# Altium footprint library Compute Module .PcbLib: 21 footprints (part 1 of 2)
Each footprint in its own frame and in the unit in brackets; x right, y up, seen from the top. Pads: shape width x height; smd on the part's side, far side on the other; paste and mask are expansions set on the pad; w line width, h text height; cw(c..) or ccw(c..) is an arc to the next point about the centre after c.
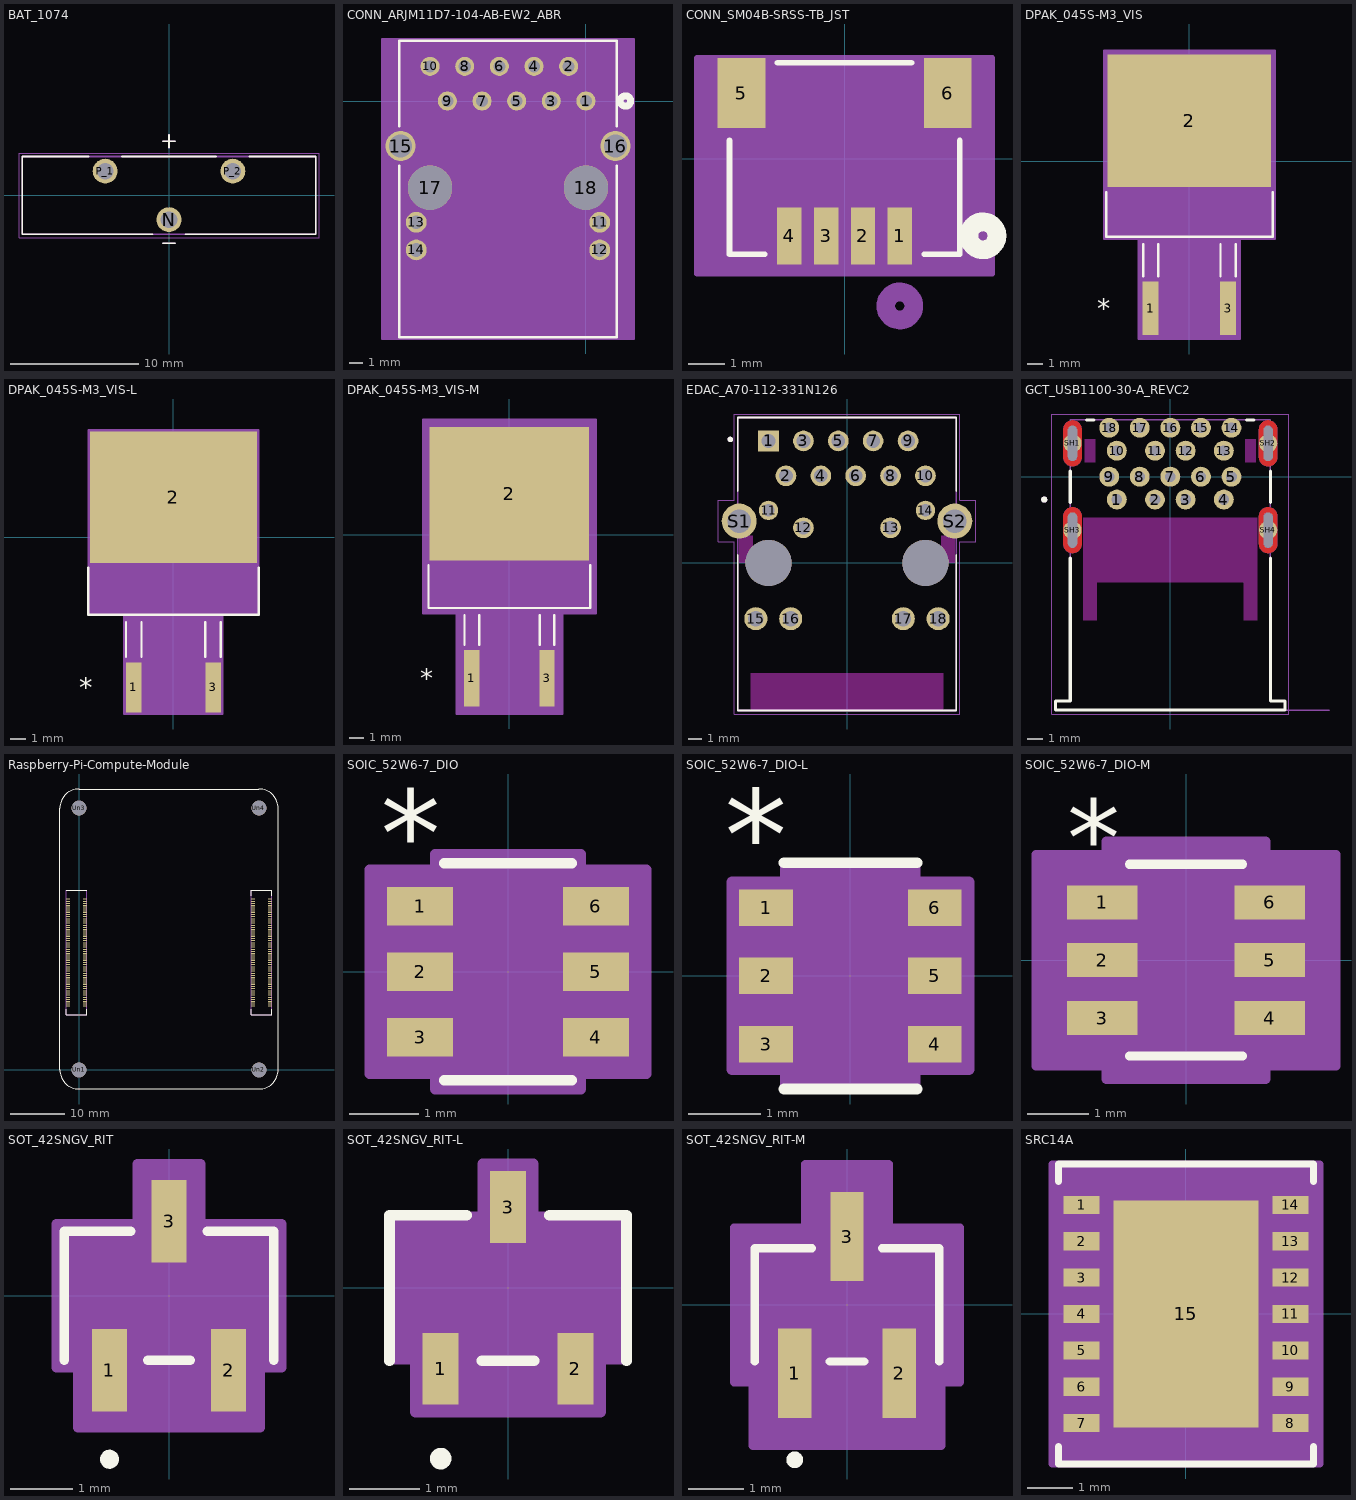
[diagram p0: the footprints below, top view; thin cyan lines are the x and y axes]

## BAT_1074 [mm]
height 24.9
pads (3):
  round 1.95 hole 1.3: N(0,-1.9) P_1(-5,1.9) P_2(5,1.9)
Top Overlay:
  lines w0.127: -6.295,3.05 -11.5,3.05 -11.5,-3.05 -1.295,-3.05 ; -3.705,3.05 3.705,3.05 ; -0.5,-3.75 0.5,-3.75 ; -0.5,4.25 0.5,4.25 ; 0,3.75 0,4.75 ; 1.295,-3.05 11.5,-3.05 11.5,3.05 6.295,3.05
Mechanical 13:
  lines w0.127: -0.5,-3.75 0.5,-3.75 ; -0.5,4.25 0.5,4.25 ; 0,3.75 0,4.75 ; -11.5,-3.05 -11.5,3.05 11.5,3.05 11.5,-3.05 -11.5,-3.05
Mechanical 15:
  lines w0.05: -11.75,-3.3 -11.75,3.3 11.75,3.3 11.75,-3.3 -11.75,-3.3
3D body "1074.step": height 19.88, standoff -1.52, extent -11.488,-2.925 11.488,3.175

## CONN_ARJM11D7-104-AB-EW2_ABR [mil] "Ethernet"
pads (18):
  round 55 / inner round 60 / far side round 55 hole 35 paste-99999 mask+0: 1(0,0) 2(-50,100) 3(-100,0) 4(-150,100) 5(-200,0) 6(-250,100) 7(-300,0) 8(-350,100) 9(-400,0) 10(-450,100)
  round 60 hole 40 paste-99999 mask+0: 11(39.76,-350) 12(39.76,-429.92) 13(-489.76,-350) 14(-489.76,-429.92)
  round 87 / inner round 60 / far side round 87 hole 67 paste-99999 mask+0: 15(-535.04,-129.92) 16(85.04,-129.92)
  round 128 / inner round 60 / far side round 128 hole 128 unplated paste-99999 mask-64: 17(-450,-250) 18(0,-250)
Top Overlay:
  circle w20: c114,0 r15
  lines w6: -539,-186.38 -539,-682 89,-682 89,-186.38 ; -539,-73.46 -539,174 89,174 89,-73.46
Bottom Overlay:
  circle w20: c114,0 r15
Mechanical 13:
  circle w20: c0,75 r15
  lines w1: -534,-677 84,-677 84,169 -534,169 -534,-677
Mechanical 15:
  region: 138.54,179 -588.54,179 -588.54,-687 138.54,-687
  lines w6: -588.54,-687 -588.54,179 138.54,179 138.54,-687 -588.54,-687
3D body "ARJM11D7-104-AB-EW2.STEP": height 543.32, standoff -141.55, extent -539.57,-680.19 89.57,172.19

## CONN_SM04B-SRSS-TB_JST [mil] "Fan Connector"
pads (6):
  rect 26x61 smd paste+0 mask+0: 1(59.06,-82.62) 2(19.68,-82.62) 3(-19.68,-82.62) 4(-59.06,-82.62)
  rect 51x75 smd paste-37.5 mask-37.5: 5(-110.24,69.94) 6(110.24,69.94)
Top Overlay:
  circle w20: c148,-82.62 r15
  lines w6: -123,19.34 -123,-102.5 -85.16,-102.5 ; -71.64,102.5 71.64,102.5 ; 85.16,-102.5 123,-102.5 123,19.34
Bottom Overlay:
  circle w20: c148,-82.62 r15
Mechanical 13:
  circle w20: c59.06,-157.62 r15
  lines w1: -118,-97.5 118,-97.5 118,97.5 -118,97.5 -118,-97.5
Mechanical 15:
  region: 157.74,107.5 -157.74,107.5 -157.74,-123.12 157.74,-123.12
  lines w6: -157.74,-123.12 -157.74,107.5 157.74,107.5 157.74,-123.12 -157.74,-123.12
3D body "SM04B-SRSS-TB.STEP": height 114.15, standoff -2.39, extent -118.11,-96.51 118.11,98.35

## DPAK_045S-M3_VIS [mil]
pads (3):
  rect 41x138 smd paste+0 mask+0: 1(-100,-380) 3(100,-380)
  rect 422x343 smd paste+0 mask+0: 2(0,104.5)
Top Overlay:
  lines w6: -215,-79.47 -215,-195 215,-195 215,-79.47 ; -119.5,-297 -119.5,-214 ; -80.5,-297 -80.5,-214 ; 80.5,-297 80.5,-214 ; 119.5,-297 119.5,-214
  text "*" at -237.5,-405 h50
Mechanical 13:
  lines w1: -210,-190 210,-190 210,190 -210,190 -210,-190 ; -119.5,-435 -119.5,-190 -80.5,-190 -80.5,-435 -119.5,-435 ; 80.5,-435 80.5,-190 119.5,-190 119.5,-435 80.5,-435
  text "*" at -112.5,-205 h50
Mechanical 15:
  region: -220,-200 -220,200 -220,286 220,286 220,200 220,-200 130.5,-200 130.5,-459 -130.5,-459 -130.5,-200
  lines w6: -220,-200 -220,200 -220,286 220,286 220,200 220,-200 130.5,-200 130.5,-459 -130.5,-459 -130.5,-200 -220,-200
3D body "DPAK_045S-M3_VIS.step": height 190.12, standoff -2.01, extent -210,-435 210,255

## DPAK_045S-M3_VIS-L [mil]
pads (3):
  rect 39x126 smd paste+0 mask+0: 1(-100,-378) 3(100,-378)
  rect 420x331 smd paste+0 mask+0: 2(0,100.5)
Top Overlay:
  lines w6: -215,-77.11 -215,-195 215,-195 215,-77.11 ; -119.5,-301 -119.5,-214 ; -80.5,-301 -80.5,-214 ; 80.5,-301 80.5,-214 ; 119.5,-301 119.5,-214
  text "*" at -237.5,-403 h50
Mechanical 13:
  lines w1: -210,-190 -210,190 210,190 210,-190 -210,-190 ; -119.5,-435 -80.5,-435 -80.5,-190 -119.5,-190 -119.5,-435 ; 80.5,-435 119.5,-435 119.5,-190 80.5,-190 80.5,-435
  text "*" at -112.5,-205 h50
Mechanical 15:
  region: -214,-194 -214,194 -214,270 214,270 214,194 214,-194 123.5,-194 123.5,-445 -123.5,-445 -123.5,-194
  lines w6: -214,-194 -123.5,-194 -123.5,-445 123.5,-445 123.5,-194 214,-194 214,194 214,270 -214,270 -214,194 -214,-194
3D body "DPAK_045S-M3_VIS.step": height 190.12, standoff -2.01, extent -210,-435 210,255

## DPAK_045S-M3_VIS-M [mil]
pads (3):
  rect 41x150 smd paste+0 mask+0: 1(-100,-382) 3(100,-382)
  rect 424x355 smd paste+0 mask+0: 2(0,108.5)
Top Overlay:
  lines w6: -215,-81.75 -215,-195 215,-195 215,-81.75 ; -119.5,-293 -119.5,-214 ; -80.5,-293 -80.5,-214 ; 80.5,-293 80.5,-214 ; 119.5,-293 119.5,-214
  text "*" at -237.5,-407 h50
Mechanical 13:
  lines w1: -210,-190 -210,190 210,190 210,-190 -210,-190 ; -119.5,-435 -80.5,-435 -80.5,-190 -119.5,-190 -119.5,-435 ; 80.5,-435 119.5,-435 119.5,-190 80.5,-190 80.5,-435
  text "*" at -112.5,-205 h50
Mechanical 15:
  region: -230,-210 -230,210 -230,306 230,306 230,210 230,-210 140.5,-210 140.5,-477 -140.5,-477 -140.5,-210
  lines w6: -230,-210 -140.5,-210 -140.5,-477 140.5,-477 140.5,-210 230,-210 230,210 230,306 -230,306 -230,210 -230,-210
3D body "DPAK_045S-M3_VIS.step": height 190.12, standoff -2.01, extent -210,-435 210,255

## EDAC_A70-112-331N126 [mm]
pads (22):
  rect 1.508x1.508 hole 1: 1(-5.715,8.89)
  round 1.508 hole 1: 2(-4.445,6.35) 3(-3.175,8.89) 4(-1.905,6.35) 5(-0.635,8.89) 6(0.635,6.35) 7(1.905,8.89) 8(3.175,6.35) 9(4.445,8.89) 10(5.715,6.35) 12(-3.175,2.56) 13(3.175,2.56)
  round 1.408 hole 0.9: 11(-5.715,3.83) 14(5.715,3.83)
  round 1.68 hole 1.12: 15(-6.64,-4.06) 16(-4.1,-4.06) 17(4.1,-4.06) 18(6.64,-4.06)
  round 2.55 hole 1.7: S1(-7.85,3.05) S2(7.85,3.05)
  round 3.35 hole 3.35 unplated: ""(-5.715,0) ""(5.715,0)
Top Overlay:
  circle w0.2: c-8.5,9 r0.1
  lines w0.127: -7.95,0.6 -7.95,-10.75 7.95,-10.75 7.95,0.6 ; -7.95,5.25 -7.95,10.6 7.95,10.6 7.95,5.25
Keep-Out Layer:
  region: 7.005,-10.75 -7.005,-10.75 -7.005,-8.05 7.005,-8.05
  region: 7.85,0 6.875,0 6.875,2 7.85,2
  region: -6.875,0 -7.85,0 -7.85,2 -6.875,2
Mechanical 13:
  circle w0.2: c-8.5,9 r0.1
  lines w0.127: -7.95,-10.75 7.95,-10.75 7.95,10.6 -7.95,10.6 -7.95,-10.75
Mechanical 15:
  lines w0.05: -9.38,1.53 -9.38,4.57 -8.2,4.57 -8.2,10.85 8.2,10.85 8.2,4.57 9.38,4.57 9.38,1.53 8.2,1.53 8.2,-11 -8.2,-11 -8.2,1.53 -9.38,1.53
3D body "A70-112-331N126--3DModel-STEP-56544.STEP": height 13.65, standoff -3.3, extent -8.1,-10.832 8.1,10.668

## GCT_USB1100-30-A_REVC2 [mm] "USB3.0 2 Sockets"
pads (22):
  round 1.3 hole 0.7: 1(-3.5,-1.5) 2(-1,-1.5) 3(1,-1.5) 4(3.5,-1.5) 5(4,0) 6(2,0) 7(0,0) 8(-2,0) 9(-4,0) 10(-3.5,1.7) 11(-1,1.7) 12(1,1.7) 13(3.5,1.7) 14(4,3.2) 15(2,3.2) 16(0,3.2) 17(-2,3.2) 18(-4,3.2)
  round 1.2 hole 0.6 slot 2.3 at 90 deg mask+0: SH1(-6.4,2.18) SH2(6.4,2.18) SH3(-6.4,-3.5) SH4(6.4,-3.5)
Top Layer:
  region: 6.431,-2.001 6.463,-2.003 6.494,-2.007 6.525,-2.013 6.555,-2.02 6.585,-2.029 6.615,-2.04 6.644,-2.052 6.672,-2.065 6.7,-2.08 6.727,-2.097 6.753,-2.115 6.778,-2.134 6.801,-2.154 6.824,-2.176 6.846,-2.199 6.866,-2.222 6.885,-2.247 6.903,-2.273 6.92,-2.3 6.935,-2.328 6.948,-2.356 6.96,-2.385 6.971,-2.415 6.98,-2.445 6.987,-2.475 6.993,-2.506 6.997,-2.537 6.999,-2.569 7,-2.6 7,-4.4 6.999,-4.431 6.997,-4.463 6.993,-4.494 6.987,-4.525 6.98,-4.555 6.971,-4.585 6.96,-4.615 6.948,-4.644 6.935,-4.672 6.92,-4.7 6.903,-4.727 6.885,-4.753 6.866,-4.778 6.846,-4.801 6.824,-4.824 6.801,-4.846 6.778,-4.866 6.753,-4.885 6.727,-4.903 6.7,-4.92 6.672,-4.935 6.644,-4.948 6.615,-4.96 6.585,-4.971 6.555,-4.98 6.525,-4.987 6.494,-4.993 6.463,-4.997 6.431,-4.999 6.4,-5 6.369,-4.999 6.337,-4.997 6.306,-4.993 6.275,-4.987 6.245,-4.98 6.215,-4.971 6.185,-4.96 6.156,-4.948 6.128,-4.935 6.1,-4.92 6.073,-4.903 6.047,-4.885 6.022,-4.866 5.999,-4.846 5.976,-4.824 5.954,-4.801 5.934,-4.778 5.915,-4.753 5.897,-4.727 5.88,-4.7 5.865,-4.672 5.852,-4.644 5.84,-4.615 5.829,-4.585 5.82,-4.555 5.813,-4.525 5.807,-4.494 5.803,-4.463 5.801,-4.431 5.8,-4.4 5.8,-2.6 5.801,-2.569 5.803,-2.537 5.807,-2.506 5.813,-2.475 5.82,-2.445 5.829,-2.415 5.84,-2.385 5.852,-2.356 5.865,-2.328 5.88,-2.3 5.897,-2.273 5.915,-2.247 5.934,-2.222 5.954,-2.199 5.976,-2.176 5.999,-2.154 6.022,-2.134 6.047,-2.115 6.073,-2.097 6.1,-2.08 6.128,-2.065 6.156,-2.052 6.185,-2.04 6.215,-2.029 6.245,-2.02 6.275,-2.013 6.306,-2.007 6.337,-2.003 6.369,-2.001 6.4,-2
  region: -6.369,-2.001 -6.337,-2.003 -6.306,-2.007 -6.275,-2.013 -6.245,-2.02 -6.215,-2.029 -6.185,-2.04 -6.156,-2.052 -6.128,-2.065 -6.1,-2.08 -6.073,-2.097 -6.047,-2.115 -6.022,-2.134 -5.999,-2.154 -5.976,-2.176 -5.954,-2.199 -5.934,-2.222 -5.915,-2.247 -5.897,-2.273 -5.88,-2.3 -5.865,-2.328 -5.852,-2.356 -5.84,-2.385 -5.829,-2.415 -5.82,-2.445 -5.813,-2.475 -5.807,-2.506 -5.803,-2.537 -5.801,-2.569 -5.8,-2.6 -5.8,-4.4 -5.801,-4.431 -5.803,-4.463 -5.807,-4.494 -5.813,-4.525 -5.82,-4.555 -5.829,-4.585 -5.84,-4.615 -5.852,-4.644 -5.865,-4.672 -5.88,-4.7 -5.897,-4.727 -5.915,-4.753 -5.934,-4.778 -5.954,-4.801 -5.976,-4.824 -5.999,-4.846 -6.022,-4.866 -6.047,-4.885 -6.073,-4.903 -6.1,-4.92 -6.128,-4.935 -6.156,-4.948 -6.185,-4.96 -6.215,-4.971 -6.245,-4.98 -6.275,-4.987 -6.306,-4.993 -6.337,-4.997 -6.369,-4.999 -6.4,-5 -6.431,-4.999 -6.463,-4.997 -6.494,-4.993 -6.525,-4.987 -6.555,-4.98 -6.585,-4.971 -6.615,-4.96 -6.644,-4.948 -6.672,-4.935 -6.7,-4.92 -6.727,-4.903 -6.753,-4.885 -6.778,-4.866 -6.801,-4.846 -6.824,-4.824 -6.846,-4.801 -6.866,-4.778 -6.885,-4.753 -6.903,-4.727 -6.92,-4.7 -6.935,-4.672 -6.948,-4.644 -6.96,-4.615 -6.971,-4.585 -6.98,-4.555 -6.987,-4.525 -6.993,-4.494 -6.997,-4.463 -6.999,-4.431 -7,-4.4 -7,-2.6 -6.999,-2.569 -6.997,-2.537 -6.993,-2.506 -6.987,-2.475 -6.98,-2.445 -6.971,-2.415 -6.96,-2.385 -6.948,-2.356 -6.935,-2.328 -6.92,-2.3 -6.903,-2.273 -6.885,-2.247 -6.866,-2.222 -6.846,-2.199 -6.824,-2.176 -6.801,-2.154 -6.778,-2.134 -6.753,-2.115 -6.727,-2.097 -6.7,-2.08 -6.672,-2.065 -6.644,-2.052 -6.615,-2.04 -6.585,-2.029 -6.555,-2.02 -6.525,-2.013 -6.494,-2.007 -6.463,-2.003 -6.431,-2.001 -6.4,-2
  region: 6.431,3.679 6.463,3.677 6.494,3.673 6.525,3.667 6.555,3.66 6.585,3.651 6.615,3.64 6.644,3.628 6.672,3.615 6.7,3.6 6.727,3.583 6.753,3.565 6.778,3.546 6.801,3.526 6.824,3.504 6.846,3.481 6.866,3.458 6.885,3.433 6.903,3.407 6.92,3.38 6.935,3.352 6.948,3.324 6.96,3.295 6.971,3.265 6.98,3.235 6.987,3.205 6.993,3.174 6.997,3.143 6.999,3.111 7,3.08 7,1.28 6.999,1.249 6.997,1.217 6.993,1.186 6.987,1.155 6.98,1.125 6.971,1.095 6.96,1.065 6.948,1.036 6.935,1.008 6.92,0.98 6.903,0.953 6.885,0.927 6.866,0.902 6.846,0.879 6.824,0.856 6.801,0.834 6.778,0.814 6.753,0.795 6.727,0.777 6.7,0.76 6.672,0.745 6.644,0.732 6.615,0.72 6.585,0.709 6.555,0.7 6.525,0.693 6.494,0.687 6.463,0.683 6.431,0.681 6.4,0.68 6.369,0.681 6.337,0.683 6.306,0.687 6.275,0.693 6.245,0.7 6.215,0.709 6.185,0.72 6.156,0.732 6.128,0.745 6.1,0.76 6.073,0.777 6.047,0.795 6.022,0.814 5.999,0.834 5.976,0.856 5.954,0.879 5.934,0.902 5.915,0.927 5.897,0.953 5.88,0.98 5.865,1.008 5.852,1.036 5.84,1.065 5.829,1.095 5.82,1.125 5.813,1.155 5.807,1.186 5.803,1.217 5.801,1.249 5.8,1.28 5.8,3.08 5.801,3.111 5.803,3.143 5.807,3.174 5.813,3.205 5.82,3.235 5.829,3.265 5.84,3.295 5.852,3.324 5.865,3.352 5.88,3.38 5.897,3.407 5.915,3.433 5.934,3.458 5.954,3.481 5.976,3.504 5.999,3.526 6.022,3.546 6.047,3.565 6.073,3.583 6.1,3.6 6.128,3.615 6.156,3.628 6.185,3.64 6.215,3.651 6.245,3.66 6.275,3.667 6.306,3.673 6.337,3.677 6.369,3.679 6.4,3.68
  region: -6.369,3.679 -6.337,3.677 -6.306,3.673 -6.275,3.667 -6.245,3.66 -6.215,3.651 -6.185,3.64 -6.156,3.628 -6.128,3.615 -6.1,3.6 -6.073,3.583 -6.047,3.565 -6.022,3.546 -5.999,3.526 -5.976,3.504 -5.954,3.481 -5.934,3.458 -5.915,3.433 -5.897,3.407 -5.88,3.38 -5.865,3.352 -5.852,3.324 -5.84,3.295 -5.829,3.265 -5.82,3.235 -5.813,3.205 -5.807,3.174 -5.803,3.143 -5.801,3.111 -5.8,3.08 -5.8,1.28 -5.801,1.249 -5.803,1.217 -5.807,1.186 -5.813,1.155 -5.82,1.125 -5.829,1.095 -5.84,1.065 -5.852,1.036 -5.865,1.008 -5.88,0.98 -5.897,0.953 -5.915,0.927 -5.934,0.902 -5.954,0.879 -5.976,0.856 -5.999,0.834 -6.022,0.814 -6.047,0.795 -6.073,0.777 -6.1,0.76 -6.128,0.745 -6.156,0.732 -6.185,0.72 -6.215,0.709 -6.245,0.7 -6.275,0.693 -6.306,0.687 -6.337,0.683 -6.369,0.681 -6.4,0.68 -6.431,0.681 -6.463,0.683 -6.494,0.687 -6.525,0.693 -6.555,0.7 -6.585,0.709 -6.615,0.72 -6.644,0.732 -6.672,0.745 -6.7,0.76 -6.727,0.777 -6.753,0.795 -6.778,0.814 -6.801,0.834 -6.824,0.856 -6.846,0.879 -6.866,0.902 -6.885,0.927 -6.903,0.953 -6.92,0.98 -6.935,1.008 -6.948,1.036 -6.96,1.065 -6.971,1.095 -6.98,1.125 -6.987,1.155 -6.993,1.186 -6.997,1.217 -6.999,1.249 -7,1.28 -7,3.08 -6.999,3.111 -6.997,3.143 -6.993,3.174 -6.987,3.205 -6.98,3.235 -6.971,3.265 -6.96,3.295 -6.948,3.324 -6.935,3.352 -6.92,3.38 -6.903,3.407 -6.885,3.433 -6.866,3.458 -6.846,3.481 -6.824,3.504 -6.801,3.526 -6.778,3.546 -6.753,3.565 -6.727,3.583 -6.7,3.6 -6.672,3.615 -6.644,3.628 -6.615,3.64 -6.585,3.651 -6.555,3.66 -6.525,3.667 -6.494,3.673 -6.463,3.677 -6.431,3.679 -6.4,3.68
Bottom Layer:
  region: 6.431,-2.001 6.463,-2.003 6.494,-2.007 6.525,-2.013 6.555,-2.02 6.585,-2.029 6.615,-2.04 6.644,-2.052 6.672,-2.065 6.7,-2.08 6.727,-2.097 6.753,-2.115 6.778,-2.134 6.801,-2.154 6.824,-2.176 6.846,-2.199 6.866,-2.222 6.885,-2.247 6.903,-2.273 6.92,-2.3 6.935,-2.328 6.948,-2.356 6.96,-2.385 6.971,-2.415 6.98,-2.445 6.987,-2.475 6.993,-2.506 6.997,-2.537 6.999,-2.569 7,-2.6 7,-4.4 6.999,-4.431 6.997,-4.463 6.993,-4.494 6.987,-4.525 6.98,-4.555 6.971,-4.585 6.96,-4.615 6.948,-4.644 6.935,-4.672 6.92,-4.7 6.903,-4.727 6.885,-4.753 6.866,-4.778 6.846,-4.801 6.824,-4.824 6.801,-4.846 6.778,-4.866 6.753,-4.885 6.727,-4.903 6.7,-4.92 6.672,-4.935 6.644,-4.948 6.615,-4.96 6.585,-4.971 6.555,-4.98 6.525,-4.987 6.494,-4.993 6.463,-4.997 6.431,-4.999 6.4,-5 6.369,-4.999 6.337,-4.997 6.306,-4.993 6.275,-4.987 6.245,-4.98 6.215,-4.971 6.185,-4.96 6.156,-4.948 6.128,-4.935 6.1,-4.92 6.073,-4.903 6.047,-4.885 6.022,-4.866 5.999,-4.846 5.976,-4.824 5.954,-4.801 5.934,-4.778 5.915,-4.753 5.897,-4.727 5.88,-4.7 5.865,-4.672 5.852,-4.644 5.84,-4.615 5.829,-4.585 5.82,-4.555 5.813,-4.525 5.807,-4.494 5.803,-4.463 5.801,-4.431 5.8,-4.4 5.8,-2.6 5.801,-2.569 5.803,-2.537 5.807,-2.506 5.813,-2.475 5.82,-2.445 5.829,-2.415 5.84,-2.385 5.852,-2.356 5.865,-2.328 5.88,-2.3 5.897,-2.273 5.915,-2.247 5.934,-2.222 5.954,-2.199 5.976,-2.176 5.999,-2.154 6.022,-2.134 6.047,-2.115 6.073,-2.097 6.1,-2.08 6.128,-2.065 6.156,-2.052 6.185,-2.04 6.215,-2.029 6.245,-2.02 6.275,-2.013 6.306,-2.007 6.337,-2.003 6.369,-2.001 6.4,-2
  region: -6.369,-2.001 -6.337,-2.003 -6.306,-2.007 -6.275,-2.013 -6.245,-2.02 -6.215,-2.029 -6.185,-2.04 -6.156,-2.052 -6.128,-2.065 -6.1,-2.08 -6.073,-2.097 -6.047,-2.115 -6.022,-2.134 -5.999,-2.154 -5.976,-2.176 -5.954,-2.199 -5.934,-2.222 -5.915,-2.247 -5.897,-2.273 -5.88,-2.3 -5.865,-2.328 -5.852,-2.356 -5.84,-2.385 -5.829,-2.415 -5.82,-2.445 -5.813,-2.475 -5.807,-2.506 -5.803,-2.537 -5.801,-2.569 -5.8,-2.6 -5.8,-4.4 -5.801,-4.431 -5.803,-4.463 -5.807,-4.494 -5.813,-4.525 -5.82,-4.555 -5.829,-4.585 -5.84,-4.615 -5.852,-4.644 -5.865,-4.672 -5.88,-4.7 -5.897,-4.727 -5.915,-4.753 -5.934,-4.778 -5.954,-4.801 -5.976,-4.824 -5.999,-4.846 -6.022,-4.866 -6.047,-4.885 -6.073,-4.903 -6.1,-4.92 -6.128,-4.935 -6.156,-4.948 -6.185,-4.96 -6.215,-4.971 -6.245,-4.98 -6.275,-4.987 -6.306,-4.993 -6.337,-4.997 -6.369,-4.999 -6.4,-5 -6.431,-4.999 -6.463,-4.997 -6.494,-4.993 -6.525,-4.987 -6.555,-4.98 -6.585,-4.971 -6.615,-4.96 -6.644,-4.948 -6.672,-4.935 -6.7,-4.92 -6.727,-4.903 -6.753,-4.885 -6.778,-4.866 -6.801,-4.846 -6.824,-4.824 -6.846,-4.801 -6.866,-4.778 -6.885,-4.753 -6.903,-4.727 -6.92,-4.7 -6.935,-4.672 -6.948,-4.644 -6.96,-4.615 -6.971,-4.585 -6.98,-4.555 -6.987,-4.525 -6.993,-4.494 -6.997,-4.463 -6.999,-4.431 -7,-4.4 -7,-2.6 -6.999,-2.569 -6.997,-2.537 -6.993,-2.506 -6.987,-2.475 -6.98,-2.445 -6.971,-2.415 -6.96,-2.385 -6.948,-2.356 -6.935,-2.328 -6.92,-2.3 -6.903,-2.273 -6.885,-2.247 -6.866,-2.222 -6.846,-2.199 -6.824,-2.176 -6.801,-2.154 -6.778,-2.134 -6.753,-2.115 -6.727,-2.097 -6.7,-2.08 -6.672,-2.065 -6.644,-2.052 -6.615,-2.04 -6.585,-2.029 -6.555,-2.02 -6.525,-2.013 -6.494,-2.007 -6.463,-2.003 -6.431,-2.001 -6.4,-2
  region: 6.431,3.679 6.463,3.677 6.494,3.673 6.525,3.667 6.555,3.66 6.585,3.651 6.615,3.64 6.644,3.628 6.672,3.615 6.7,3.6 6.727,3.583 6.753,3.565 6.778,3.546 6.801,3.526 6.824,3.504 6.846,3.481 6.866,3.458 6.885,3.433 6.903,3.407 6.92,3.38 6.935,3.352 6.948,3.324 6.96,3.295 6.971,3.265 6.98,3.235 6.987,3.205 6.993,3.174 6.997,3.143 6.999,3.111 7,3.08 7,1.28 6.999,1.249 6.997,1.217 6.993,1.186 6.987,1.155 6.98,1.125 6.971,1.095 6.96,1.065 6.948,1.036 6.935,1.008 6.92,0.98 6.903,0.953 6.885,0.927 6.866,0.902 6.846,0.879 6.824,0.856 6.801,0.834 6.778,0.814 6.753,0.795 6.727,0.777 6.7,0.76 6.672,0.745 6.644,0.732 6.615,0.72 6.585,0.709 6.555,0.7 6.525,0.693 6.494,0.687 6.463,0.683 6.431,0.681 6.4,0.68 6.369,0.681 6.337,0.683 6.306,0.687 6.275,0.693 6.245,0.7 6.215,0.709 6.185,0.72 6.156,0.732 6.128,0.745 6.1,0.76 6.073,0.777 6.047,0.795 6.022,0.814 5.999,0.834 5.976,0.856 5.954,0.879 5.934,0.902 5.915,0.927 5.897,0.953 5.88,0.98 5.865,1.008 5.852,1.036 5.84,1.065 5.829,1.095 5.82,1.125 5.813,1.155 5.807,1.186 5.803,1.217 5.801,1.249 5.8,1.28 5.8,3.08 5.801,3.111 5.803,3.143 5.807,3.174 5.813,3.205 5.82,3.235 5.829,3.265 5.84,3.295 5.852,3.324 5.865,3.352 5.88,3.38 5.897,3.407 5.915,3.433 5.934,3.458 5.954,3.481 5.976,3.504 5.999,3.526 6.022,3.546 6.047,3.565 6.073,3.583 6.1,3.6 6.128,3.615 6.156,3.628 6.185,3.64 6.215,3.651 6.245,3.66 6.275,3.667 6.306,3.673 6.337,3.677 6.369,3.679 6.4,3.68
  region: -6.369,3.679 -6.337,3.677 -6.306,3.673 -6.275,3.667 -6.245,3.66 -6.215,3.651 -6.185,3.64 -6.156,3.628 -6.128,3.615 -6.1,3.6 -6.073,3.583 -6.047,3.565 -6.022,3.546 -5.999,3.526 -5.976,3.504 -5.954,3.481 -5.934,3.458 -5.915,3.433 -5.897,3.407 -5.88,3.38 -5.865,3.352 -5.852,3.324 -5.84,3.295 -5.829,3.265 -5.82,3.235 -5.813,3.205 -5.807,3.174 -5.803,3.143 -5.801,3.111 -5.8,3.08 -5.8,1.28 -5.801,1.249 -5.803,1.217 -5.807,1.186 -5.813,1.155 -5.82,1.125 -5.829,1.095 -5.84,1.065 -5.852,1.036 -5.865,1.008 -5.88,0.98 -5.897,0.953 -5.915,0.927 -5.934,0.902 -5.954,0.879 -5.976,0.856 -5.999,0.834 -6.022,0.814 -6.047,0.795 -6.073,0.777 -6.1,0.76 -6.128,0.745 -6.156,0.732 -6.185,0.72 -6.215,0.709 -6.245,0.7 -6.275,0.693 -6.306,0.687 -6.337,0.683 -6.369,0.681 -6.4,0.68 -6.431,0.681 -6.463,0.683 -6.494,0.687 -6.525,0.693 -6.555,0.7 -6.585,0.709 -6.615,0.72 -6.644,0.732 -6.672,0.745 -6.7,0.76 -6.727,0.777 -6.753,0.795 -6.778,0.814 -6.801,0.834 -6.824,0.856 -6.846,0.879 -6.866,0.902 -6.885,0.927 -6.903,0.953 -6.92,0.98 -6.935,1.008 -6.948,1.036 -6.96,1.065 -6.971,1.095 -6.98,1.125 -6.987,1.155 -6.993,1.186 -6.997,1.217 -6.999,1.249 -7,1.28 -7,3.08 -6.999,3.111 -6.997,3.143 -6.993,3.174 -6.987,3.205 -6.98,3.235 -6.971,3.265 -6.96,3.295 -6.948,3.324 -6.935,3.352 -6.92,3.38 -6.903,3.407 -6.885,3.433 -6.866,3.458 -6.846,3.481 -6.824,3.504 -6.801,3.526 -6.778,3.546 -6.753,3.565 -6.727,3.583 -6.7,3.6 -6.672,3.615 -6.644,3.628 -6.615,3.64 -6.585,3.651 -6.555,3.66 -6.525,3.667 -6.494,3.673 -6.463,3.677 -6.431,3.679 -6.4,3.68
Top Overlay:
  circle w0.2: c-8.25,-1.5 r0.1
  lines w0.2: -6.55,-5.32 -6.55,-14.67 -7.5,-14.67 -7.5,-15.28 7.5,-15.28 7.5,-14.67 6.55,-14.67 6.55,-5.32 ; -6.55,-1.68 -6.55,0.36 ; -5.48,3.72 -5,3.72 ; 5,3.72 5.48,3.72 ; 6.55,-1.68 6.55,0.36
Top Solder:
  drawing of 4 lines, arcs and shapes, not listed
Bottom Solder:
  drawing of 4 lines, arcs and shapes, not listed
Keep-Out Layer:
  region: 5.6,0.95 4.9,0.95 4.9,2.45 5.6,2.45
  region: -4.9,0.95 -5.6,0.95 -5.6,2.45 -4.9,2.45
  region: 5.7,-9.4 4.8,-9.4 4.8,-6.9 -4.8,-6.9 -4.8,-9.4 -5.7,-9.4 -5.7,-2.7 5.7,-2.7
  region: 5.6,0.95 4.9,0.95 4.9,2.45 5.6,2.45
  region: -4.9,0.95 -5.6,0.95 -5.6,2.45 -4.9,2.45
  region: 5.7,-9.4 4.8,-9.4 4.8,-6.9 -4.8,-6.9 -4.8,-9.4 -5.7,-9.4 -5.7,-2.7 5.7,-2.7
Mechanical 13:
  circle w0.2: c-8.25,-1.5 r0.1
  lines w0.1: 10.4,-15.28 7.5,-15.28 ; 7.5,-15.28 -7.5,-15.28 -7.5,-14.67 -6.55,-14.67 -6.55,3.72 6.55,3.72 6.55,-14.67 7.5,-14.67 7.5,-15.28
  text "PCB EDGE" at 8.1,-15.08 h1.27
Mechanical 15:
  lines w0.05: -7.75,-15.53 7.75,-15.53 7.75,4.1 -7.75,4.1 -7.75,-15.53
3D body "usb1100-30-a.stp": height 16.2, standoff -1.68, extent -7.5,-15.317 7.5,3.683

## Raspberry-Pi-Compute-Module [mm] "Compute Module Base"
pads (204):
  rect 0.7x0.2 smd: 1(-2,31.3) 2(1.08,31.3) 3(-2,30.9) 4(1.08,30.9) 5(-2,30.5) 6(1.08,30.5) 7(-2,30.1) 8(1.08,30.1) 9(-2,29.7) 10(1.08,29.7) 11(-2,29.3) 12(1.08,29.3) 13(-2,28.9) 14(1.08,28.9) 15(-2,28.5) 16(1.08,28.5) 17(-2,28.1) 18(1.08,28.1) 19(-2,27.7) 20(1.08,27.7) 21(-2,27.3) 22(1.08,27.3) 23(-2,26.9) 24(1.08,26.9) 25(-2,26.5) 26(1.08,26.5) 27(-2,26.1) 28(1.08,26.1) 29(-2,25.7) 30(1.08,25.7) 31(-2,25.3) 32(1.08,25.3) 33(-2,24.9) 34(1.08,24.9) 35(-2,24.5) 36(1.08,24.5) 37(-2,24.1) 38(1.08,24.1) 39(-2,23.7) 40(1.08,23.7) 41(-2,23.3) 42(1.08,23.3) 43(-2,22.9) 44(1.08,22.9) 45(-2,22.5) 46(1.08,22.5) 47(-2,22.1) 48(1.08,22.1) 49(-2,21.7) 50(1.08,21.7) 51(-2,21.3) 52(1.08,21.3) 53(-2,20.9) 54(1.08,20.9) 55(-2,20.5) 56(1.08,20.5) 57(-2,20.1) 58(1.08,20.1) 59(-2,19.7) 60(1.08,19.7) 61(-2,19.3) 62(1.08,19.3) 63(-2,18.9) 64(1.08,18.9) 65(-2,18.5) 66(1.08,18.5) 67(-2,18.1) 68(1.08,18.1) 69(-2,17.7) 70(1.08,17.7) 71(-2,17.3) 72(1.08,17.3) 73(-2,16.9) 74(1.08,16.9) 75(-2,16.5) 76(1.08,16.5) 77(-2,16.1) 78(1.08,16.1) 79(-2,15.7) 80(1.08,15.7) 81(-2,15.3) 82(1.08,15.3) 83(-2,14.9) 84(1.08,14.9) 85(-2,14.5) 86(1.08,14.5) 87(-2,14.1) 88(1.08,14.1) 89(-2,13.7) 90(1.08,13.7) 91(-2,13.3) 92(1.08,13.3) 93(-2,12.9) 94(1.08,12.9) 95(-2,12.5) 96(1.08,12.5) 97(-2,12.1) 98(1.08,12.1) 99(-2,11.7) 100(1.08,11.7) 101(31.92,31.3) 102(35,31.3) 103(31.92,30.9) 104(35,30.9) 105(31.92,30.5) 106(35,30.5) 107(31.92,30.1) 108(35,30.1) 109(31.92,29.7) 110(35,29.7) 111(31.92,29.3) 112(35,29.3) 113(31.92,28.9) 114(35,28.9) 115(31.92,28.5) 116(35,28.5) 117(31.92,28.1) 118(35,28.1) 119(31.92,27.7) 120(35,27.7) 121(31.92,27.3) 122(35,27.3) 123(31.92,26.9) 124(35,26.9) 125(31.92,26.5) 126(35,26.5) 127(31.92,26.1) 128(35,26.1) 129(31.92,25.7) 130(35,25.7) 131(31.92,25.3) 132(35,25.3) 133(31.92,24.9) 134(35,24.9) 135(31.92,24.5) 136(35,24.5) 137(31.92,24.1) 138(35,24.1) 139(31.92,23.7) 140(35,23.7) 141(31.92,23.3) 142(35,23.3) 143(31.92,22.9) 144(35,22.9) 145(31.92,22.5) 146(35,22.5) 147(31.92,22.1) 148(35,22.1) 149(31.92,21.7) 150(35,21.7) 151(31.92,21.3) 152(35,21.3) 153(31.92,20.9) 154(35,20.9) 155(31.92,20.5) 156(35,20.5) 157(31.92,20.1) 158(35,20.1) 159(31.92,19.7) 160(35,19.7) 161(31.92,19.3) 162(35,19.3) 163(31.92,18.9) 164(35,18.9) 165(31.92,18.5) 166(35,18.5) 167(31.92,18.1) 168(35,18.1) 169(31.92,17.7) 170(35,17.7) 171(31.92,17.3) 172(35,17.3) 173(31.92,16.9) 174(35,16.9) 175(31.92,16.5) 176(35,16.5) 177(31.92,16.1) 178(35,16.1) 179(31.92,15.7) 180(35,15.7) 181(31.92,15.3) 182(35,15.3) 183(31.92,14.9) 184(35,14.9) 185(31.92,14.5) 186(35,14.5) 187(31.92,14.1) 188(35,14.1) 189(31.92,13.7) 190(35,13.7) 191(31.92,13.3) 192(35,13.3) 193(31.92,12.9) 194(35,12.9) 195(31.92,12.5) 196(35,12.5) 197(31.92,12.1) 198(35,12.1) 199(31.92,11.7) 200(35,11.7)
  round 2.7 hole 2.7: Un1(0,0) Un2(33,0) Un3(0,48) Un4(33,48)
Top Overlay:
  lines w0.12: -2.35,11.1 -2.35,10.1 1.43,10.1 1.43,11.1 ; -2.35,32.9 1.43,32.9 ; 31.57,11.1 31.57,10.1 35.35,10.1 35.35,11.1 ; 31.57,31.9 31.57,32.9 35.35,32.9 35.35,31.9 ; -3.5,0 ccw(c0,0) 0,-3.5 33,-3.5 ccw(c33,0) 36.5,0 36.5,48 ccw(c33,48) 33,51.5 0,51.5 ccw(c0,48) -3.5,48 -3.5,0
Mechanical 12:
  lines w0.12: -2.35,10.1 -2.35,32.9 1.43,32.9 1.43,10.1 -2.35,10.1 ; 31.57,10.1 35.35,10.1 35.35,32.9 31.57,32.9 31.57,10.1
3D body "10164227-1001a1rlf.stp": height 1.41, standoff -0.04, extent -2.15,10.2 1.23,32.8
3D body "10164227-1001a1rlf.stp": height 1.41, standoff -0.04, extent 31.77,10.2 35.15,32.8

## SOIC_52W6-7_DIO [mil]
pads (6):
  rect 37.5x22 smd paste+0 mask+0: 1(-50.25,37.4) 2(-50.25,0) 3(-50.25,-37.4) 4(50.25,-37.4) 5(50.25,0) 6(50.25,37.4)
Top Overlay:
  lines w6: -36.5,-62 36.5,-62 ; -36.5,62 36.5,62
  text "*" at -72.75,54.4 h50
Mechanical 13:
  lines w0: -12,57 ccw(c0,57) 12,57
  lines w1: -55,-47.4 -31.5,-47.4 -31.5,-27.4 -55,-27.4 -55,-47.4 ; -55,-10 -31.5,-10 -31.5,10 -55,10 -55,-10 ; -55,27.4 -31.5,27.4 -31.5,47.4 -55,47.4 -55,27.4 ; -31.5,-57 -31.5,57 31.5,57 31.5,-57 -31.5,-57 ; 31.5,-47.4 55,-47.4 55,-27.4 31.5,-27.4 31.5,-47.4 ; 31.5,-10 55,-10 55,10 31.5,10 31.5,-10 ; 31.5,27.4 55,27.4 55,47.4 31.5,47.4 31.5,27.4
  text "*" at -29,4 h50
Mechanical 15:
  region: -41.5,-58.4 -79,-58.4 -79,58.4 -41.5,58.4 -41.5,67 41.5,67 41.5,58.4 79,58.4 79,-58.4 41.5,-58.4 41.5,-67 -41.5,-67
  lines w6: -79,-58.4 -41.5,-58.4 -41.5,-67 41.5,-67 41.5,-58.4 79,-58.4 79,58.4 41.5,58.4 41.5,67 -41.5,67 -41.5,58.4 -79,58.4 -79,-58.4
3D body "SOIC_52W6-7_DIO.step": height 57.09, standoff 0, extent -55,-57.01 55,57.01

## SOIC_52W6-7_DIO-L [mil]
pads (6):
  rect 29.5x20 smd paste+0 mask+0: 1(-46.25,37.4) 2(-46.25,0) 3(-46.25,-37.4) 4(46.25,-37.4) 5(46.25,0) 6(46.25,37.4)
Top Overlay:
  lines w6: -36.5,-62 36.5,-62 ; -36.5,62 36.5,62
  text "*" at -68.75,52.4 h50
Mechanical 13:
  lines w0: -12,57 ccw(c0,57) 12,57
  lines w1: -55,-47.4 -31.5,-47.4 -31.5,-27.4 -55,-27.4 -55,-47.4 ; -55,-10 -31.5,-10 -31.5,10 -55,10 -55,-10 ; -55,27.4 -31.5,27.4 -31.5,47.4 -55,47.4 -55,27.4 ; -31.5,-57 -31.5,57 31.5,57 31.5,-57 -31.5,-57 ; 31.5,-47.4 55,-47.4 55,-27.4 31.5,-27.4 31.5,-47.4 ; 31.5,-10 55,-10 55,10 31.5,10 31.5,-10 ; 31.5,27.4 55,27.4 55,47.4 31.5,47.4 31.5,27.4
  text "*" at -29,4 h50
Mechanical 15:
  region: -35.5,-51.4 -65,-51.4 -65,51.4 -35.5,51.4 -35.5,61 35.5,61 35.5,51.4 65,51.4 65,-51.4 35.5,-51.4 35.5,-61 -35.5,-61
  lines w6: -65,-51.4 -35.5,-51.4 -35.5,-61 35.5,-61 35.5,-51.4 65,-51.4 65,51.4 35.5,51.4 35.5,61 -35.5,61 -35.5,51.4 -65,51.4 -65,-51.4
3D body "SOIC_52W6-7_DIO.step": height 57.09, standoff 0, extent -55,-57.01 55,57.01

## SOIC_52W6-7_DIO-M [mil]
pads (6):
  rect 45.5x22 smd paste+0 mask+0: 1(-54.25,37.4) 2(-54.25,0) 3(-54.25,-37.4) 4(54.25,-37.4) 5(54.25,0) 6(54.25,37.4)
Top Overlay:
  lines w6: -36.5,-62 36.5,-62 ; -36.5,62 36.5,62
  text "*" at -76.75,54.4 h50
Mechanical 13:
  lines w0: -12,57 ccw(c0,57) 12,57
  lines w1: -55,-47.4 -55,-27.4 -31.5,-27.4 -31.5,-47.4 -55,-47.4 ; -55,-10 -55,10 -31.5,10 -31.5,-10 -55,-10 ; -55,27.4 -55,47.4 -31.5,47.4 -31.5,27.4 -55,27.4 ; -31.5,-57 31.5,-57 31.5,57 -31.5,57 -31.5,-57 ; 31.5,-47.4 31.5,-27.4 55,-27.4 55,-47.4 31.5,-47.4 ; 31.5,-10 31.5,10 55,10 55,-10 31.5,-10 ; 31.5,27.4 31.5,47.4 55,47.4 55,27.4 31.5,27.4
  text "*" at -29,4 h50
Mechanical 15:
  region: -51.5,-68.4 -97,-68.4 -97,68.4 -51.5,68.4 -51.5,77 51.5,77 51.5,68.4 97,68.4 97,-68.4 51.5,-68.4 51.5,-77 -51.5,-77
  lines w6: -97,-68.4 -97,68.4 -51.5,68.4 -51.5,77 51.5,77 51.5,68.4 97,68.4 97,-68.4 51.5,-68.4 51.5,-77 -51.5,-77 -51.5,-68.4 -97,-68.4
3D body "SOIC_52W6-7_DIO.step": height 57.09, standoff 0, extent -55,-57.01 55,57.01

## SOT_42SNGV_RIT [mil] "HDMI Power"
pads (3):
  rect 22x52 smd paste+0 mask+0: 1(-37.5,-47) 2(37.5,-47) 3(0,47)
Top Overlay:
  circle w6: c-37.5,-103 r3
  lines w6: -66,-40.5 -66,40.5 -24.1,40.5 ; -13.4,-40.5 13.4,-40.5 ; 24.1,40.5 66,40.5 66,-40.5
Mechanical 13:
  circle w0: c-37.5,-25.5 r3
  lines w1: -61,-35.5 61,-35.5 61,35.5 -61,35.5 -61,-35.5 ; -47.5,-59 -47.5,-35.5 -27.5,-35.5 -27.5,-59 -47.5,-59 ; -10,35.5 10,35.5 10,59 -10,59 -10,35.5 ; 27.5,-59 27.5,-35.5 47.5,-35.5 47.5,-59 27.5,-59
Mechanical 15:
  region: -71,-45.5 -71,45.5 -20,45.5 -20,83 20,83 20,45.5 71,45.5 71,-45.5 57.5,-45.5 57.5,-83 -57.5,-83 -57.5,-45.5
  lines w6: -71,-45.5 -71,45.5 -20,45.5 -20,83 20,83 20,45.5 71,45.5 71,-45.5 57.5,-45.5 57.5,-83 -57.5,-83 -57.5,-45.5 -71,-45.5
3D body "SOT_42SNGV_RIT.step": height 51.1, standoff 0, extent -60.98,-59.02 60.98,59.02

## SOT_42SNGV_RIT-L [mil] "HDMI Power"
pads (3):
  rect 20x40 smd paste+0 mask+0: 1(-37.5,-45) 2(37.5,-45) 3(0,45)
Top Overlay:
  circle w6: c-37.5,-95 r3
  lines w6: -66,-40.5 -66,40.5 -23.1,40.5 ; -14.4,-40.5 14.4,-40.5 ; 23.1,40.5 66,40.5 66,-40.5
Mechanical 13:
  circle w0: c-37.5,-25.5 r3
  lines w1: -61,-35.5 61,-35.5 61,35.5 -61,35.5 -61,-35.5 ; -47.5,-59 -47.5,-35.5 -27.5,-35.5 -27.5,-59 -47.5,-59 ; -10,35.5 10,35.5 10,59 -10,59 -10,35.5 ; 27.5,-59 27.5,-35.5 47.5,-35.5 47.5,-59 27.5,-59
Mechanical 15:
  region: -65,-39.5 -65,39.5 -14,39.5 -14,69 14,69 14,39.5 65,39.5 65,-39.5 51.5,-39.5 51.5,-69 -51.5,-69 -51.5,-39.5
  lines w6: -65,-39.5 -65,39.5 -14,39.5 -14,69 14,69 14,39.5 65,39.5 65,-39.5 51.5,-39.5 51.5,-69 -51.5,-69 -51.5,-39.5 -65,-39.5
3D body "SOT_42SNGV_RIT.step": height 51.1, standoff 0, extent -60.98,-59.02 60.98,59.02

## SOT_42SNGV_RIT-M [mil]
pads (3):
  rect 24x64 smd paste+0 mask+0: 1(-37.5,-49) 2(37.5,-49) 3(0,49)
Top Overlay:
  circle w6: c-37.5,-111 r3
  lines w6: -66,-40.5 -66,40.5 -25.1,40.5 ; -12.4,-40.5 12.4,-40.5 ; 25.1,40.5 66,40.5 66,-40.5
Mechanical 13:
  circle w0: c-37.5,-25.5 r3
  lines w1: -61,-35.5 -61,35.5 61,35.5 61,-35.5 -61,-35.5 ; -47.5,-59 -27.5,-59 -27.5,-35.5 -47.5,-35.5 -47.5,-59 ; -10,35.5 -10,59 10,59 10,35.5 -10,35.5 ; 27.5,-59 47.5,-59 47.5,-35.5 27.5,-35.5 27.5,-59
Mechanical 15:
  region: -81,-55.5 -81,55.5 -30,55.5 -30,101 30,101 30,55.5 81,55.5 81,-55.5 67.5,-55.5 67.5,-101 -67.5,-101 -67.5,-55.5
  lines w6: -81,-55.5 -67.5,-55.5 -67.5,-101 67.5,-101 67.5,-55.5 81,-55.5 81,55.5 30,55.5 30,101 -30,101 -30,55.5 -81,55.5 -81,-55.5
3D body "SOT_42SNGV_RIT.step": height 51.1, standoff 0, extent -60.98,-59.02 60.98,59.02

## SRC14A [mm]
pads (15):
  rect 0.8x0.4 smd paste-0.2 mask-0.406: 1(-2.3,2.4) 2(-2.3,1.6) 3(-2.3,0.8) 4(-2.3,0) 5(-2.3,-0.8) 6(-2.3,-1.6) 7(-2.3,-2.4) 8(2.3,-2.4) 9(2.3,-1.6) 10(2.3,-0.8) 11(2.3,0) 12(2.3,0.8) 13(2.3,1.6) 14(2.3,2.4)
  rect 3.2x5 smd paste-1.6 mask-2.502: 15(0,0)
Top Overlay:
  lines w0.152: -2.807,-2.915 -2.807,-3.302 2.807,-3.302 2.807,-2.915 ; -2.807,2.915 -2.807,3.302 2.807,3.302 2.807,2.915
Top Paste:
  region: 1.5,-0.1 0.1,-0.1 0.1,-2.4 1.5,-2.4
  region: 1.5,2.4 0.1,2.4 0.1,0.1 1.5,0.1
  region: -0.1,-0.1 -1.5,-0.1 -1.5,-2.4 -0.1,-2.4
  region: -0.1,2.4 -1.5,2.4 -1.5,0.1 -0.1,0.1
  region: 2.903,2.6 2.103,2.6 2.103,2.2 2.903,2.2
  region: 2.903,1.8 2.103,1.8 2.103,1.4 2.903,1.4
  region: 2.903,1 2.103,1 2.103,0.6 2.903,0.6
  region: 2.903,0.2 2.103,0.2 2.103,-0.2 2.903,-0.2
  region: 2.903,-0.6 2.103,-0.6 2.103,-1 2.903,-1
  region: 2.903,-1.4 2.103,-1.4 2.103,-1.8 2.903,-1.8
  region: 2.903,-2.2 2.103,-2.2 2.103,-2.6 2.903,-2.6
  region: -2.103,-2.2 -2.903,-2.2 -2.903,-2.6 -2.103,-2.6
  region: -2.103,-1.4 -2.903,-1.4 -2.903,-1.8 -2.103,-1.8
  region: -2.103,-0.6 -2.903,-0.6 -2.903,-1 -2.103,-1
  region: -2.103,0.2 -2.903,0.2 -2.903,-0.2 -2.103,-0.2
  region: -2.103,1 -2.903,1 -2.903,0.6 -2.103,0.6
  region: -2.103,1.8 -2.903,1.8 -2.903,1.4 -2.103,1.4
  region: -2.103,2.6 -2.903,2.6 -2.903,2.2 -2.103,2.2
Mechanical 13:
  lines w0.025: -2.553,2.54 -2.045,3.048 ; -2.553,-3.048 -2.553,3.048 2.553,3.048 2.553,-3.048 -2.553,-3.048
Mechanical 15:
  region: 2.954,-3.302 -2.954,-3.302 -2.954,3.302 2.954,3.302
  lines w0.152: -2.954,-3.302 2.954,-3.302 2.954,3.302 -2.954,3.302 -2.954,-3.302
3D body "SRC14A.step": height 0.99, standoff 0, extent -2.604,-3.048 2.604,3.048